# Altium footprint library TriggersLib.PcbLib: 262 footprints (part 3 of 17)
Each footprint in its own frame and in the unit in brackets; x right, y up, seen from the top. Pads: shape width x height; smd on the part's side, far side on the other; paste and mask are expansions set on the pad; w line width, h text height; cw(c..) or ccw(c..) is an arc to the next point about the centre after c.
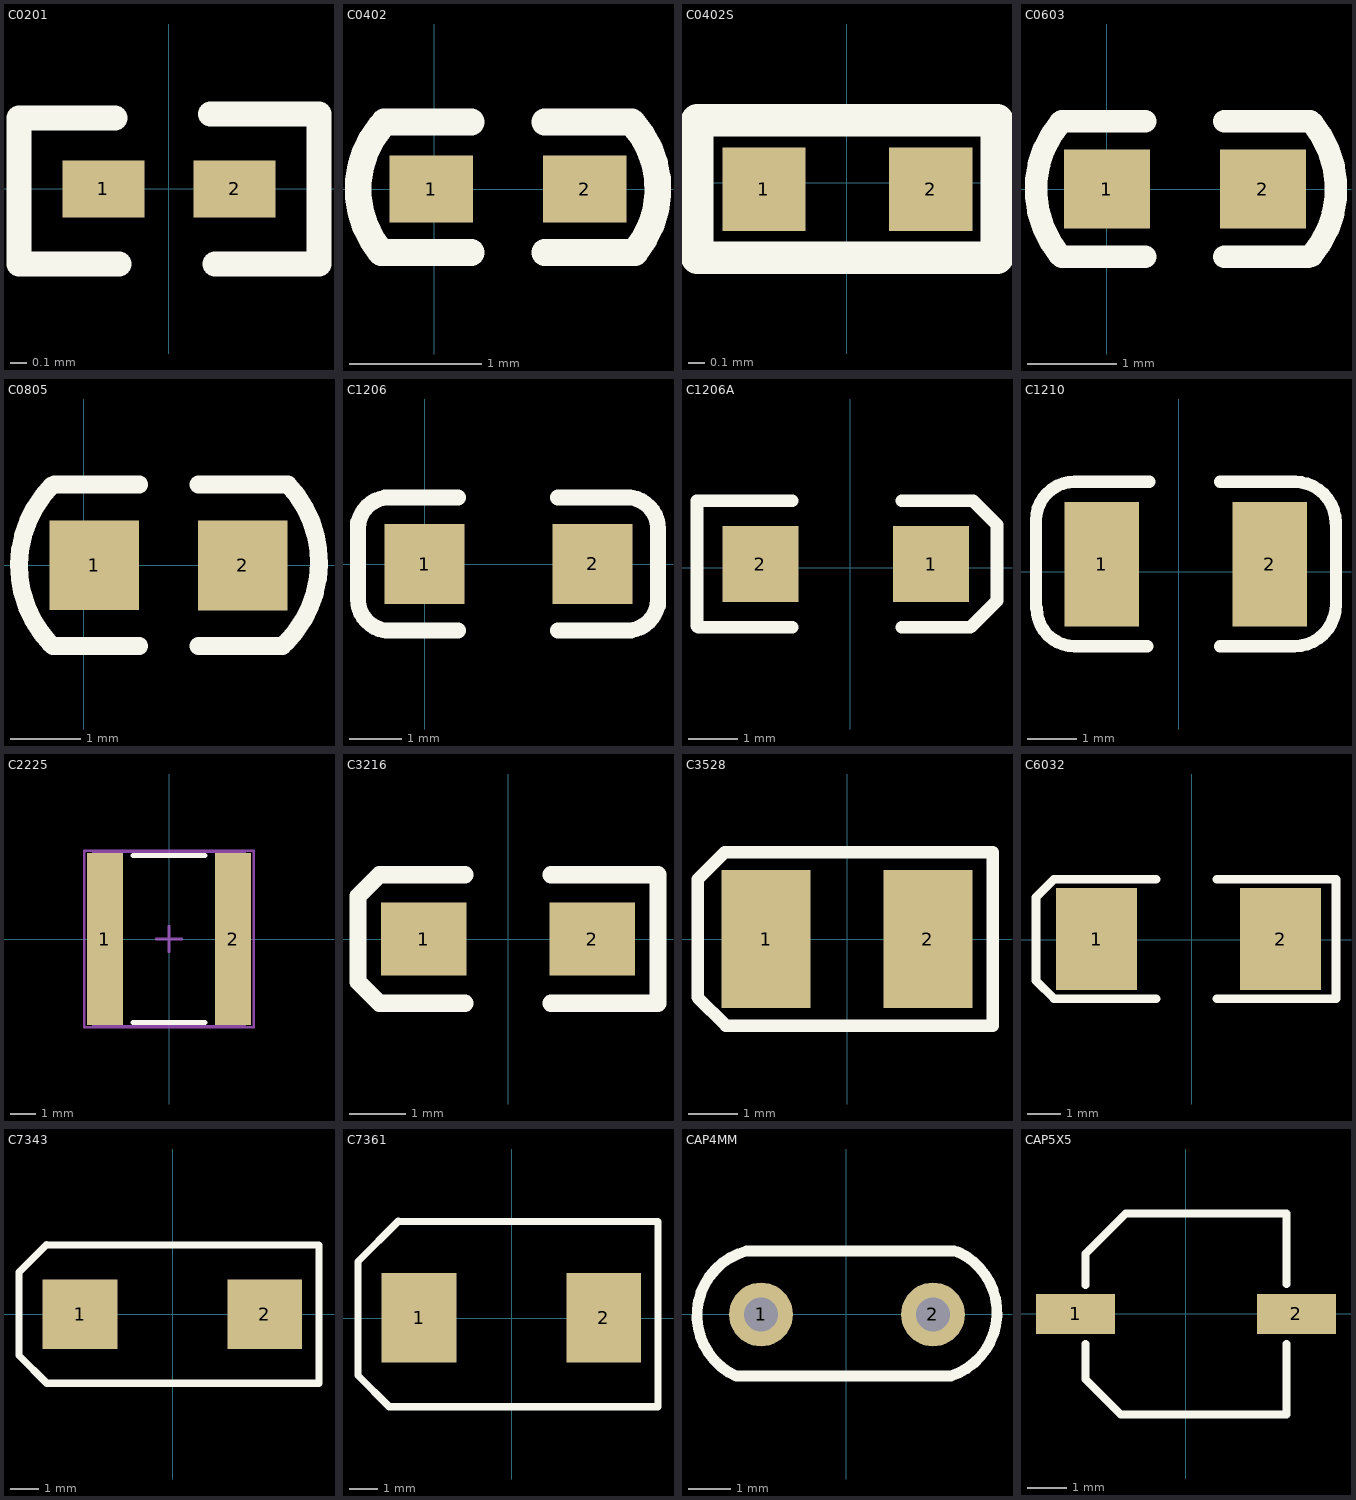
[diagram p2: the footprints below, top view; thin cyan lines are the x and y axes]

## C0201 [mm]
pads (2):
  rect 0.5x0.35 smd: 1(-0.4,0) 2(0.4,0)
Top Overlay:
  lines w0.152: -0.33,0.432 -0.914,0.432 -0.914,-0.457 -0.305,-0.457 ; 0.254,0.457 0.914,0.457 0.914,-0.457 0.279,-0.457
3D body "User Library-cap_0201.step": height 0.28, standoff -0.02, extent -0.3,-0.152 0.3,0.148

## C0402 [mil]
pads (2):
  rect 25x20 smd: 1(-1,0) 2(45,0)
Top Overlay:
  lines w8: -15.94,-19 11,-19 ; -15.94,-18.95 cw(c6.42,-0.05) -15.95,18.84 ; -15,20 11,20 ; 33,-19 59.95,-19 ; 33,20 59,20 cw(c37.58,0.05) 59.95,-18.84
3D body "cap_0402.STEP": height 19.68, standoff 0, extent 2.31,-10 41.69,9.69

## C0402S [mil] "1/16W"
pads (2):
  rect 20x20 smd: 1(-19.93,-1.58) 2(20.07,-1.58)
Top Overlay:
  lines w7.87: -36,-18 -36,15 36,15 36,-18 -36,-18
3D body "cap_0402.STEP": height 19.68, standoff 0, extent -19.68,-11.42 19.69,8.26

## C0603 [mil]
pads (2):
  rect 38x35 smd: 1(0,0) 2(69,0)
Top Overlay:
  lines w10: -21,-29 cw(c14.45,-0.04) -20.48,29.56 ; -20,-30 17,-30 ; -20,30 17,30 ; 52,-30 89,-30 ; 52,30 90,30 ; 90.48,-29.56 ccw(c55.55,0.04) 91,29
3D body "User Library-0603 SMD Capacitor.STEP": height 11.89, standoff 0, extent 3.8,-15.8 66.8,15.7

## C0805 [mil]
pads (2):
  rect 50x50 smd: 1(6,0) 2(88.7,-0.1)
Top Overlay:
  lines w10: -18.66,-43.67 cw(c27.24,-0.08) -17.7,44.5 ; -17.2,-45 31,-45 ; -16.3,45 31,45 ; 64,-45 111,-45 ; 64,45 113.1,45 ; 112.92,-43.04 ccw(c67.98,1.54) 114,45
3D body "User Library-0805 SMD Capacitor.STEP": height 30.39, standoff -0.39, extent 7.93,-24.5 86.67,24.71

## C1206 [mil] "3216/A型"
pads (2):
  rect 60x60 smd: 1(0,0) 2(126,0)
Top Overlay:
  lines w11.81: -50,-26 ccw(c-26.5,-26.5) -27,-50 ; -50,27 cw(c-26.5,26.5) -26,50 ; 151,-50 ccw(c151.5,-26.5) 175,-27 ; 152,50 cw(c151.5,26.5) 175,26
  lines w12: -50,-27 -50,31 ; -29,-50 25,-50 ; -28,50 25,50 ; 100,-50 153,-50 ; 100,50 154,50 ; 175,-31 175,27
3D body "Capacitor 1206 SMD1.step": height 39.45, standoff 0, extent 0.01,-31.49 126,31.5

## C1206A [mil] "3216/A型"
pads (2):
  rect 60x60 smd: 1(64,3) 2(-71,3)
Top Overlay:
  lines w10: -121,53 -121,-46 -120,-47 -46,-47 ; -120,53 -46,53 ; 41,-47 94,-47 ; 41,53 95,53 ; 94,53 97,53 116,34 116,-26 95,-47
3D body "Capacitor 1206 SMD1.step": height 39.45, standoff 0, extent -66.99,-28.49 58.99,34.5

## C1210 [mil]
pads (2):
  rect 60x100 smd: 1(-62,6) 2(73,6)
Top Overlay:
  lines w10: -114.8,-29.36 -114.8,41.08 cw(c-83.75,41.08) -83.75,72.13 ; -114.27,-29.36 ccw(c-83.63,-29.36) -83.63,-60 -25.3,-60 ; -83.75,72 -24,72 ; 33,-60 92.52,-60 ccw(c92.52,-26.32) 126.2,-26.32 126.2,39.82 ; 33,72 93.32,72 ; 93,72 cw(c93,39.12) 125.88,39.12
3D body "1210(3225M) Cap.STEP": height 67.1, standoff 0, extent -72.75,-44 84.75,54

## C2225 [mm] "Chip Capacitor, Body 5.7x6.4mm, IPC High Density"
height 1.4
pads (2):
  rect 1.4x6.7 smd: 1(-2.5,0) 2(2.5,0)
Top Overlay:
  lines w0.2: -1.4,-3.25 1.4,-3.25 ; -1.4,3.25 1.4,3.25
Mechanical 13:
  lines w0.1: -2.95,-3.4 -2.95,3.4 2.95,3.4 2.95,-3.4 -2.95,-3.4
Mechanical 15:
  lines w0.1: -0.5,0 0.5,0 ; 0,-0.5 0,0.5 ; -3.3,-3.45 -3.3,3.45 3.3,3.45 3.3,-3.45 -3.3,-3.45
3D body "User Library-SMD CAPACITOR.STEP": height 1, standoff 0, extent -2.8,-3.023 2.8,3.277

## C3216 [mil] "A型/1206"
pads (2):
  rect 60x51.18 smd: 1(-59,0) 2(59,0)
Top Overlay:
  lines w12: -30,-45 -90,-45 -105,-30 -105,30 -90,45 -30,45 ; 30,-45 105,-45 105,45 30,45
3D body "TAJ-A.STEP": height 62.99, standoff 0, extent -63,-31 62.99,31.99

## C3528 [mil] "B型"
pads (2):
  rect 70.87x110 smd: 1(-64.5,0) 2(64.5,0)
Top Overlay:
  lines w10: -119,-46.5 -119,47.5 -97.5,69 116,69 116,-69 -96.5,-69 -119,-46.5
3D body "TAJ-B.STEP": height 74.8, standoff 0, extent -68.9,-55.11 68.9,55.12

## C6032 [mil] "C型"
pads (2):
  rect 95x120 smd: 1(-112,1) 2(104,1)
Top Overlay:
  lines w10: -42,-69 -156,-69 -162,-69 -183,-48 -183,50 -163,70 -162,71 -42,71 ; 29,-69 169,-69 169,71 29,71
3D body "TAJ-C.STEP": height 102.36, standoff 0, extent -121.11,-61.99 115.11,63.99

## C7343 [mm] "D型"
pads (2):
  rect 2.6x2.4 smd: 1(-3.202,0.007) 2(3.198,0.007)
Top Overlay:
  lines w0.254: -4.369,-2.388 5.08,-2.388 5.08,2.388 ; -4.362,-2.388 -5.325,-1.425 -5.325,1.457 -4.369,2.413 5.08,2.406
3D body: height 0.3, standoff 0, extent -3.487,-0.869 -3.392,0.82
3D body: height 0.3, standoff 0, extent 3.308,-0.855 3.512,0.915
3D body "TAJ-D.STEP": height 2.9, standoff 0, extent -3.65,-2.124 3.65,2.176

## C7361 [mm] "D型"
pads (2):
  rect 2.6x3.1 smd: 1(-3.202,0.007) 2(3.198,0.007)
Top Overlay:
  lines w0.254: -5.325,-1.99 -4.242,-3.073 5.08,-3.073 5.08,3.352 -3.931,3.359 -5.325,1.965 -5.325,-1.99
3D body "capcp7361x38.step": height 3.45, standoff 0, extent -3.75,-3.048 3.75,3.252

## CAP4MM [mm]
pads (2):
  round 1.5 hole 0.8: 1(-2,0) 2(2.04,0)
Top Overlay:
  lines w0.254: -2.58,-1.45 cw(c-1.94,-0.023) -2.34,1.49 ; -2.52,-1.45 2.42,-1.45 ; -2.32,1.49 2.538,1.49 ; 2.459,-1.447 ccw(c1.98,0.042) 2.62,1.47
3D body "RAD.2.step": height 7.5, standoff -1, extent -3.465,-0.899 3.526,0.798

## CAP5X5 [mm]
pads (2):
  rect 2x1 smd: 1(-2.794,0) 2(2.794,0)
Top Overlay:
  lines w0.2: -2.54,-0.762 -2.54,-1.651 -1.651,-2.54 2.54,-2.54 2.54,-0.762 ; -2.54,0.73 -2.54,1.524 -1.524,2.54 2.54,2.54 2.54,0.762
3D body "SL-B.STEP": height 5.2, standoff 0, extent -2.274,-2.15 2.326,2.15